# Altium footprint library connectors.PcbLib: 256 footprints (part 2 of 16)
Each footprint in its own frame and in the unit in brackets; x right, y up, seen from the top. Pads: shape width x height; smd on the part's side, far side on the other; paste and mask are expansions set on the pad; w line width, h text height; cw(c..) or ccw(c..) is an arc to the next point about the centre after c.
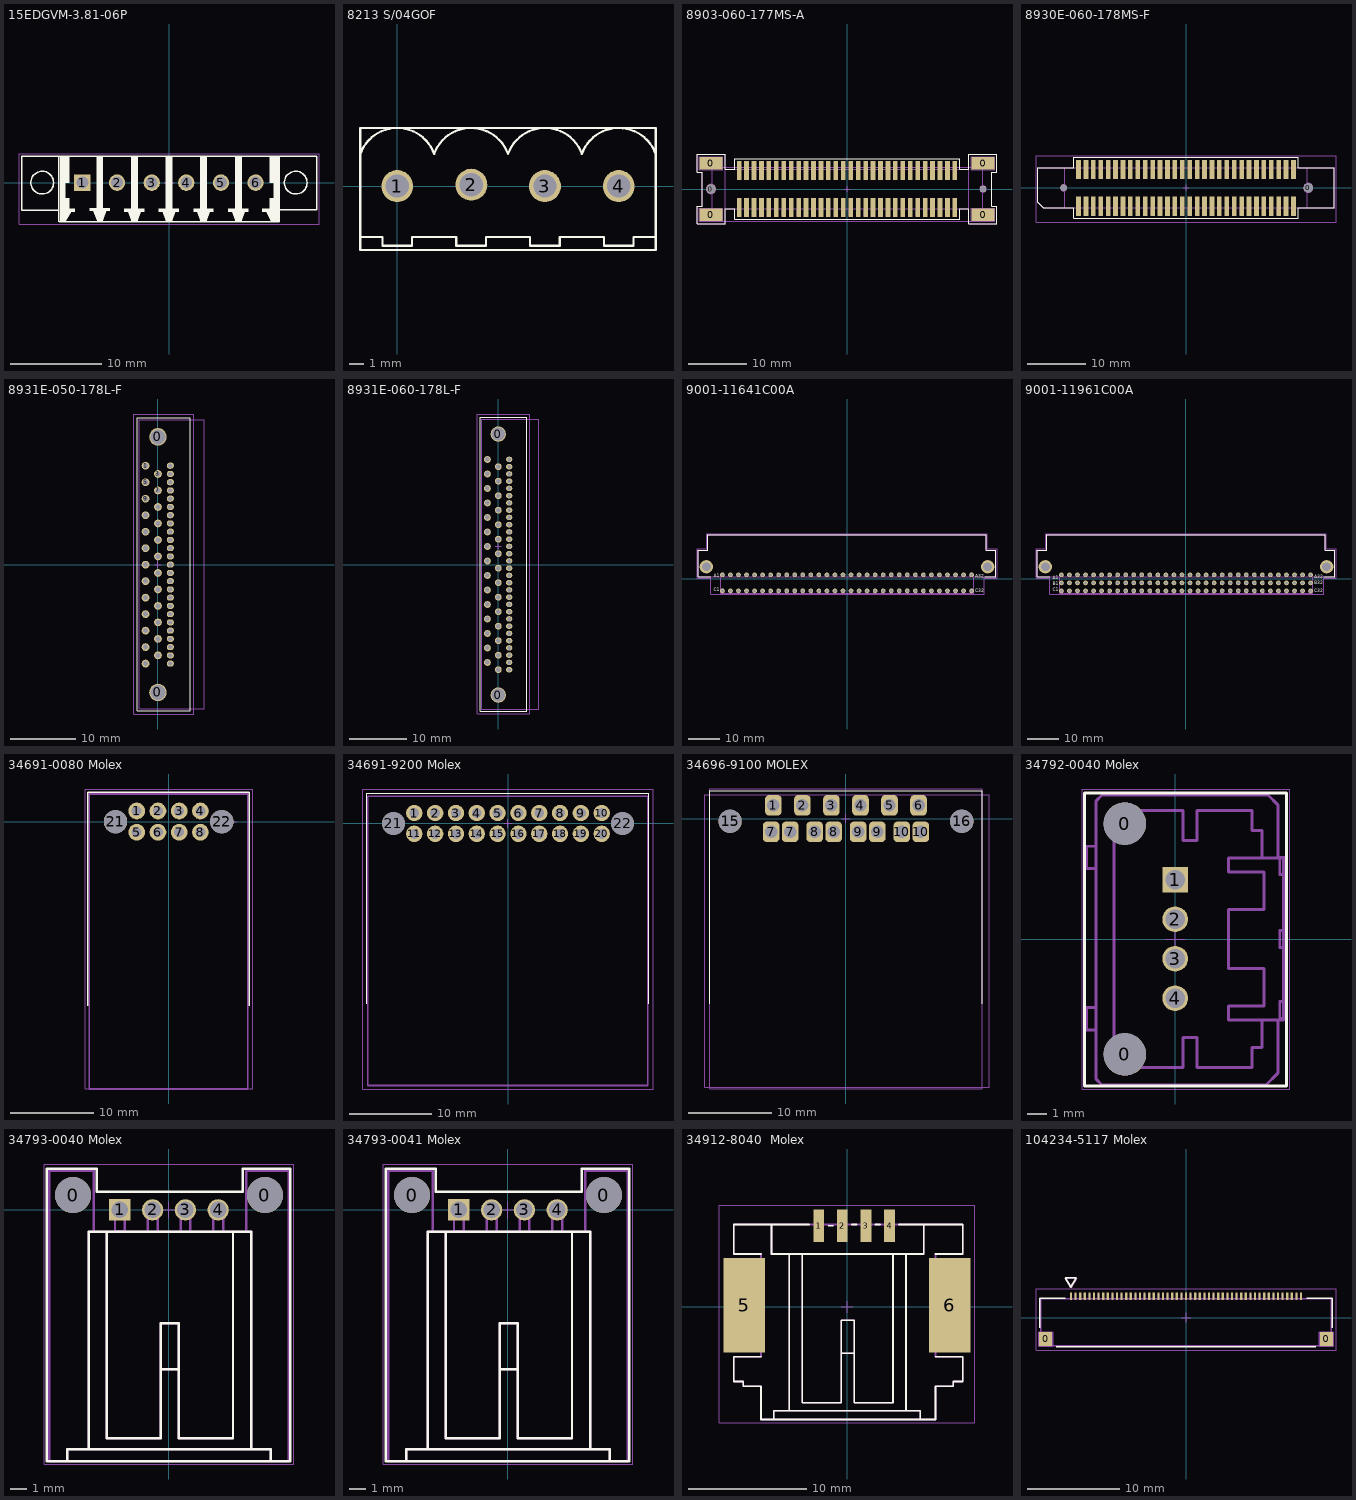
[diagram p1: the footprints below, top view; thin cyan lines are the x and y axes]

## 15EDGVM-3.81-06P [mm] "Разъем на плату, вилка DAGSON"
height 9.2
pads (6):
  rect 1.8x1.8 hole 1.3: 1(-9.525,0)
  round 1.8 hole 1.3: 2(-5.715,0) 3(-1.905,0) 4(1.905,0) 5(5.715,0) 6(9.525,0)
Top Overlay:
  circle w0.15: c13.944,0 r1.25
  circle w0.15: c-13.945,0 r1.25
  region: 7.285,2.8 7.285,-2.9 7.985,-2.9 7.985,2.8
  region: 7.335,-4.3 6.935,-3.2 6.535,-3.2 6.535,-2.9 8.735,-2.9 8.735,-3.2 8.335,-3.2 7.935,-4.3
  region: -4.105,-4.3 -4.505,-3.2 -4.905,-3.2 -4.905,-2.9 -2.705,-2.9 -2.705,-3.2 -3.105,-3.2 -3.505,-4.3
  region: -0.305,-4.3 -0.705,-3.2 -1.105,-3.2 -1.105,-2.9 1.095,-2.9 1.095,-3.2 0.695,-3.2 0.295,-4.3
  region: 3.495,-4.3 3.095,-3.2 2.695,-3.2 2.695,-2.9 4.895,-2.9 4.895,-3.2 4.495,-3.2 4.095,-4.3
  region: -4.155,2.8 -4.155,-2.9 -3.455,-2.9 -3.455,2.8
  region: -0.355,2.8 -0.355,-2.9 0.345,-2.9 0.345,2.8
  region: 3.445,2.8 3.445,-2.9 4.145,-2.9 4.145,2.8
  region: -10.965,2.8 -10.965,0 -11.415,0 -11.415,-1.7 -10.965,-1.7 -10.965,-2.9 -10.365,-2.9 -10.365,-3.2 -10.765,-3.2 -11.415,-4.3 -11.99,-4.3 -11.99,2.8
  region: 11.07,2.8 11.07,0 11.545,0 11.545,-1.7 11.07,-1.7 11.095,-2.9 10.245,-2.9 10.245,-3.2 10.67,-3.2 11.245,-4.3 12.045,-4.3 12.045,2.8
  region: -7.965,2.9 -7.965,-2.8 -7.265,-2.8 -7.265,2.9
  region: -7.915,-4.2 -8.315,-3.1 -8.715,-3.1 -8.715,-2.8 -6.515,-2.8 -6.515,-3.1 -6.915,-3.1 -7.315,-4.2
  lines w0.15: -16.205,-3.027 -16.205,2.896 -16.201,2.9 -12.115,2.9 -12.115,-4.3 ; -16.205,-3.023 -16.201,-3.027 -12.11,-3.027 ; -12.065,-4.3 12.135,-4.3 12.135,2.9 ; -12.065,2.9 12.135,2.9 ; -6.915,2.9 -2.824,2.9 ; 12.135,-2.997 16.231,-2.997 16.231,2.9 12.135,2.9 ; 16.226,2.9 16.231,2.896
TopAssy 13:
TopCourt 15:
  lines w0.05: -0.5,0 0.5,0 ; 0,-0.5 0,0.5 ; -16.5,-4.6 16.5,-4.6 16.5,3.2 -16.5,3.2 -16.5,-4.6

## 8213 S/04GOF [mm] "Разъем на плату, шаг 5.08, вилка 25.350.3453.0 WIECON"
height 12
pads (4):
  round 2.2 hole 1.6: 1(0,0) 2(5.1,0.1) 3(10.16,0) 4(15.24,0)
Top Overlay:
  lines w0.15: -2.545,2.202 cw(c0,1.3) 2.545,2.202 ; -2.54,-3.5 -1.016,-3.5 -1.016,-4.1 1.016,-4.1 1.016,-3.5 4.064,-3.5 4.064,-4.1 6.096,-4.1 6.096,-3.5 9.144,-3.5 9.144,-4.1 11.176,-4.1 11.176,-3.5 14.224,-3.5 14.224,-4.1 16.256,-4.1 16.256,-3.5 17.78,-3.5 ; 2.536,2.205 cw(c5.08,1.3) 7.625,2.202 ; 7.615,2.202 cw(c10.16,1.3) 12.705,2.202 ; 12.696,2.205 cw(c15.24,1.3) 17.785,2.202 ; -2.54,-4.4 -2.54,4 17.78,4 17.78,-4.4 -2.54,-4.4
TopAssy 13:
3D body "Wieland_25.350.3453.0_CAD STEP data 8213 S.STP": height 12.1, standoff -3.4, extent -3.26,-4.4 18.46,4

## 8903-060-177MS-A [mm] "LOW PROFILE IDC CONNECTOR, SMD"
pads (66):
  rect 4x2.2 smd: 0(-23.215,-4.4) 0(-23.215,4.4) 0(23.215,-4.4) 0(23.215,4.4)
  round 1.6 hole 1.6 unplated: 0(-23.215,0)
  round 1.1 hole 1.1 unplated: 0(23.215,0)
  rect 0.8x3.3 smd: 1(18.415,-3.15) 2(18.415,3.15) 3(17.145,-3.15) 4(17.145,3.15) 5(15.875,-3.15) 6(15.875,3.15) 7(14.605,-3.15) 8(14.605,3.15) 9(13.335,-3.15) 10(13.335,3.15) 11(12.065,-3.15) 12(12.065,3.15) 13(10.795,-3.15) 14(10.795,3.15) 15(9.525,-3.15) 16(9.525,3.15) 17(8.255,-3.15) 18(8.255,3.15) 19(6.985,-3.15) 20(6.985,3.15) 21(5.715,-3.15) 22(5.715,3.15) 23(4.445,-3.15) 24(4.445,3.15) 25(3.175,-3.15) 26(3.175,3.15) 27(1.905,-3.15) 28(1.905,3.15) 29(0.635,-3.15) 30(0.635,3.15) 31(-0.635,-3.15) 32(-0.635,3.15) 33(-1.905,-3.15) 34(-1.905,3.15) 35(-3.175,-3.15) 36(-3.175,3.15) 37(-4.445,-3.15) 38(-4.445,3.15) 39(-5.715,-3.15) 40(-5.715,3.15) 41(-6.985,-3.15) 42(-6.985,3.15) 43(-8.255,-3.15) 44(-8.255,3.15) 45(-9.525,-3.15) 46(-9.525,3.15) 47(-10.795,-3.15) 48(-10.795,3.15) 49(-12.065,-3.15) 50(-12.065,3.15) 51(-13.335,-3.15) 52(-13.335,3.15) 53(-14.605,-3.15) 54(-14.605,3.15) 55(-15.875,-3.15) 56(-15.875,3.15) 57(-17.145,-3.15) 58(-17.145,3.15) 59(-18.415,-3.15) 60(-18.415,3.15)
Top Overlay:
  lines w0.15: -25.6,5.898 -25.6,2.9 -24.7,2.9 -24.7,-2.902 -25.6,-2.902 -25.6,-5.9 -20.8,-5.9 -20.8,-3.4 -19.2,-3.4 -19.2,-5.2 19.2,-5.2 19.2,-3.4 20.8,-3.4 20.8,-5.9 25.6,-5.9 25.6,-2.902 24.7,-2.902 24.7,2.9 25.6,2.9 25.6,5.898 ; -25.6,5.9 -20.8,5.9 -20.8,3.4 -19.2,3.4 -19.2,5.2 19.2,5.2 19.2,3.4 20.8,3.4 20.8,5.9 25.6,5.9
  text "." at 18.3,-5.8 h1.52
TopAssy 13:
  drawing of 220 lines, arcs and shapes, not listed
TopCourt 15:
  lines w0.05: -0.5,0 0.5,0 ; 0,-0.5 0,0.5 ; -23,-5.5 -23,3.7 23.2,3.7 23.2,-5.5 -23,-5.5
3D body "8903-060-177MS-A_stp.stp": height 4.61, standoff -0.89, extent -24.7,-6.125 24.73,6.125

## 8930E-060-178MS-F [mm] "LOW PROFILE IDC CONNECTOR, SMD"
height 5
pads (62):
  round 1.1 hole 1.1 unplated: 0(-20.955,0)
  round 1.6 hole 1.6 unplated: 0(20.955,0)
  rect 0.8x3.3 smd: 1(-18.415,-3.15) 2(-18.415,3.15) 3(-17.145,-3.15) 4(-17.145,3.15) 5(-15.875,-3.15) 6(-15.875,3.15) 7(-14.605,-3.15) 8(-14.605,3.15) 9(-13.335,-3.15) 10(-13.335,3.15) 11(-12.065,-3.15) 12(-12.065,3.15) 13(-10.795,-3.15) 14(-10.795,3.15) 15(-9.525,-3.15) 16(-9.525,3.15) 17(-8.255,-3.15) 18(-8.255,3.15) 19(-6.985,-3.15) 20(-6.985,3.15) 21(-5.715,-3.15) 22(-5.715,3.15) 23(-4.445,-3.15) 24(-4.445,3.15) 25(-3.175,-3.15) 26(-3.175,3.15) 27(-1.905,-3.15) 28(-1.905,3.15) 29(-0.635,-3.15) 30(-0.635,3.15) 31(0.635,-3.15) 32(0.635,3.15) 33(1.905,-3.15) 34(1.905,3.15) 35(3.175,-3.15) 36(3.175,3.15) 37(4.445,-3.15) 38(4.445,3.15) 39(5.715,-3.15) 40(5.715,3.15) 41(6.985,-3.15) 42(6.985,3.15) 43(8.255,-3.15) 44(8.255,3.15) 45(9.525,-3.15) 46(9.525,3.15) 47(10.795,-3.15) 48(10.795,3.15) 49(12.065,-3.15) 50(12.065,3.15) 51(13.335,-3.15) 52(13.335,3.15) 53(14.605,-3.15) 54(14.605,3.15) 55(15.875,-3.15) 56(15.875,3.15) 57(17.145,-3.15) 58(17.145,3.15) 59(18.415,-3.15) 60(18.415,3.15)
Top Overlay:
  lines w0.15: -25.4,-2.5 -24.5,-3.4 -20.8,-3.4 -19.2,-3.4 -19.2,-5.2 19.2,-5.2 19.2,-3.4 20.8,-3.4 25.4,-3.4 25.4,3.4 20.8,3.4 19.2,3.4 19.2,5.2 -19.2,5.2 -19.2,3.4 -20.8,3.4 -25.4,3.4 -25.4,-2.5
  text "." at -18.3,-5.8 h1.52
TopAssy 13:
  drawing of 193 lines, arcs and shapes, not listed
TopCourt 15:
  lines w0.05: -0.5,0 0.5,0 ; 0,-0.5 0,0.5 ; -25.7,-5.9 -25.7,5.5 25.7,5.5 25.7,-5.9 -25.7,-5.9
3D body "P39444_8930E-060-178MS-F_s.stp": height 5.01, standoff -0.79, extent -25.415,-4.3 25.415,4.3

## 8931E-050-178L-F [mm] "LOW PROFILE IDC CONNECTOR Right angle, Through hole"
pads (52):
  round 2.7 hole 2.3: 0(0,-19.685) 0(0,19.685)
  round 1.2 hole 0.8: 1(-1.905,15.24) 3(0,13.97) 5(-1.905,12.7) 7(0,11.43) 9(-1.905,10.16) 11(0,8.89) 13(-1.905,7.62) 15(0,6.35) 17(-1.905,5.08) 19(0,3.81) 21(-1.905,2.54) 23(0,1.27) 25(-1.905,0) 27(0,-1.27) 29(-1.905,-2.54) 31(0,-3.81) 33(-1.905,-5.08) 35(0,-6.35) 37(-1.905,-7.62) 39(0,-8.89) 41(-1.905,-10.16) 43(0,-11.43) 45(-1.905,-12.7) 47(0,-13.97) 49(-1.905,-15.24)
  oval 1.1x0.95 hole 0.65: 2(1.905,15.24) 4(1.905,13.97) 6(1.905,12.7) 8(1.905,11.43) 10(1.905,10.16) 12(1.905,8.89) 14(1.905,7.62) 16(1.905,6.35) 18(1.905,5.08) 20(1.905,3.81) 22(1.905,2.54) 24(1.905,1.27) 26(1.905,0) 28(1.905,-1.27) 30(1.905,-2.54) 32(1.905,-3.81) 34(1.905,-5.08) 36(1.905,-6.35) 38(1.905,-7.62) 40(1.905,-8.89) 42(1.905,-10.16) 44(1.905,-11.43) 46(1.905,-12.7) 48(1.905,-13.97) 50(1.905,-15.24)
Top Overlay:
  lines w0.15: -3.2,-22.5 -3.2,22.6 5,22.6 5,-22.5 -3.2,-22.5
  text "." at -4.245,15.69 h1.52
TopAssy 13:
  lines w0.15: -2.9,-22.2 7.1,-22.2 7.1,22.3 -2.9,22.3 -2.9,-22.2
TopCourt 15:
  lines w0.05: -0.5,0 0.5,0 ; 0,-0.5 0,0.5 ; -3.7,-23 5.5,-23 5.5,23.2 -3.7,23.2 -3.7,-23
3D body "P39455_8931E-050-178L-F_s.stp": height 7.01, standoff -2.99, extent -2.895,-22.24 7.105,22.24

## 8931E-060-178L-F [mm] "LOW PROFILE IDC CONNECTOR Right angle, Through hole"
pads (62):
  round 2.7 hole 2.3: 0(0,-22.86) 0(0,22.86)
  round 1.2 hole 0.8: 1(-1.905,18.415) 3(0,17.145) 5(-1.905,15.875) 7(0,14.605) 9(-1.905,13.335) 11(0,12.065) 13(-1.905,10.795) 15(0,9.525) 17(-1.905,8.255) 19(0,6.985) 21(-1.905,5.715) 23(0,4.445) 25(-1.905,3.175) 27(0,1.905) 29(-1.905,0.635) 31(0,-0.635) 33(-1.905,-1.905) 35(0,-3.175) 37(-1.905,-4.445) 39(0,-5.715) 41(-1.905,-6.985) 43(0,-8.255) 45(-1.905,-9.525) 47(0,-10.795) 49(-1.905,-12.065) 51(0,-13.335) 53(-1.905,-14.605) 55(0,-15.875) 57(-1.905,-17.145) 59(0,-18.415)
  oval 1.1x0.95 hole 0.65: 2(1.905,18.415) 4(1.905,17.145) 6(1.905,15.875) 8(1.905,14.605) 10(1.905,13.335) 12(1.905,12.065) 14(1.905,10.795) 16(1.905,9.525) 18(1.905,8.255) 20(1.905,6.985) 22(1.905,5.715) 24(1.905,4.445) 26(1.905,3.175) 28(1.905,1.905) 30(1.905,0.635) 32(1.905,-0.635) 34(1.905,-1.905) 36(1.905,-3.175) 38(1.905,-4.445) 40(1.905,-5.715) 42(1.905,-6.985) 44(1.905,-8.255) 46(1.905,-9.525) 48(1.905,-10.795) 50(1.905,-12.065) 52(1.905,-13.335) 54(1.905,-14.605) 56(1.905,-15.875) 58(1.905,-17.145) 60(1.905,-18.415)
Top Overlay:
  lines w0.15: -3.2,-25.675 5,-25.675 5,25.775 -3.2,25.775 -3.2,-25.675
  text "." at -4.245,18.865 h1.52
TopAssy 13:
  lines w0.15: -2.9,-25.375 7.1,-25.375 7.1,25.475 -2.9,25.475 -2.9,-25.375
TopCourt 15:
  lines w0.05: -0.5,3.175 0.5,3.175 ; 0,2.675 0,3.675 ; -3.7,-26.175 5.5,-26.175 5.5,26.375 -3.7,26.375 -3.7,-26.175
3D body "P39455_8931E-060-178L-F_s.stp": height 7.01, standoff -2.99, extent -2.895,-25.415 7.105,25.415

## 9001-11641C00A [mm] "DIN 41612 C Type Male_Right Angle 64 pin"
height 11.1
pads (66):
  round 1.5 hole 1: A1(-39.37,1.27) A2(-36.83,1.27) A3(-34.29,1.27) A4(-31.75,1.27) A5(-29.21,1.27) A6(-26.67,1.27) A7(-24.13,1.27) A8(-21.59,1.27) A9(-19.05,1.27) A10(-16.51,1.27) A11(-13.97,1.27) A12(-11.43,1.27) A13(-8.89,1.27) A14(-6.35,1.27) A15(-3.81,1.27) A16(-1.27,1.27) A17(1.27,1.27) A18(3.81,1.27) A19(6.35,1.27) A20(8.89,1.27) A21(11.43,1.27) A22(13.97,1.27) A23(16.51,1.27) A24(19.05,1.27) A25(21.59,1.27) A26(24.13,1.27) A27(26.67,1.27) A28(29.21,1.27) A29(31.75,1.27) A30(34.29,1.27) A31(36.83,1.27) A32(39.37,1.27) C1(-39.37,-3.81) C2(-36.83,-3.81) C3(-34.29,-3.81) C4(-31.75,-3.81) C5(-29.21,-3.81) C6(-26.67,-3.81) C7(-24.13,-3.81) C8(-21.59,-3.81) C9(-19.05,-3.81) C10(-16.51,-3.81) C11(-13.97,-3.81) C12(-11.43,-3.81) C13(-8.89,-3.81) C14(-6.35,-3.81) C15(-3.81,-3.81) C16(-1.27,-3.81) C17(1.27,-3.81) C18(3.81,-3.81) C19(6.35,-3.81) C20(8.89,-3.81) C21(11.43,-3.81) C22(13.97,-3.81) C23(16.51,-3.81) C24(19.05,-3.81) C25(21.59,-3.81) C26(24.13,-3.81) C27(26.67,-3.81) C28(29.21,-3.81) C29(31.75,-3.81) C30(34.29,-3.81) C31(36.83,-3.81) C32(39.37,-3.81)
  round 4.2 hole 2.8: MH1(-44.45,3.81) MH2(44.45,3.81)
Top Overlay:
  lines w0.15: -43.067,0.71 -47,0.71 -47,9.1 -44,9.1 -44,13.91 -9.13,13.91 28.27,13.91 44,13.91 44,9.1 47,9.1 47,0.71 43.457,0.71
  text "A1" at -42.05,0.55 h1
  text "C1" at -42.15,-3.95 h1
  text "A32" at 40.55,0.35 h1
  text "C32" at 40.55,-4.15 h1
TopAssy 13:
  circle w0.1: c44.45,3.81 r1.334
  circle w0.1: c-44.45,3.81 r1.334
  circle w0.1: c-39.37,1.27 r0.5
  circle w0.1: c-39.37,-3.81 r0.5
  circle w0.1: c39.37,-3.81 r0.5
  circle w0.1: c39.37,1.27 r0.5
  lines w0.1: -39.939,0.71 -39.937,0.708 -39.937,-4.521 40.039,-4.521 40.039,0.71 ; -47,0.71 47,0.71 47,9.1 44,9.1 44,13.91 -44,13.91 -44,9.1 -47,9.1 -47,0.71
TopCourt 15:
  lines w0.05: -47.4,0.2 -47.4,9.506 -44.306,9.506 -44.304,9.509 -44.304,14.3 44.304,14.3 44.304,9.509 44.306,9.506 47.4,9.506 47.4,0.2 ; -47.399,0.2 -43,0.2 -43,-4.9 43.4,-4.9 43.4,0.2 47.399,0.2
3D body "9001-11641C00A.STEP": height 11.01, standoff -1.09, extent -47,-4.109 47,13.91

## 9001-11961C00A [mm] "DIN 41612 C Type Male_Right Angle 96 pin"
height 11.1
pads (98):
  round 1.5 hole 1: A1(-39.37,1.27) A2(-36.83,1.27) A3(-34.29,1.27) A4(-31.75,1.27) A5(-29.21,1.27) A6(-26.67,1.27) A7(-24.13,1.27) A8(-21.59,1.27) A9(-19.05,1.27) A10(-16.51,1.27) A11(-13.97,1.27) A12(-11.43,1.27) A13(-8.89,1.27) A14(-6.35,1.27) A15(-3.81,1.27) A16(-1.27,1.27) A17(1.27,1.27) A18(3.81,1.27) A19(6.35,1.27) A20(8.89,1.27) A21(11.43,1.27) A22(13.97,1.27) A23(16.51,1.27) A24(19.05,1.27) A25(21.59,1.27) A26(24.13,1.27) A27(26.67,1.27) A28(29.21,1.27) A29(31.75,1.27) A30(34.29,1.27) A31(36.83,1.27) A32(39.37,1.27) B1(-39.37,-1.27) B2(-36.83,-1.27) B3(-34.29,-1.27) B4(-31.75,-1.27) B5(-29.21,-1.27) B6(-26.67,-1.27) B7(-24.13,-1.27) B8(-21.59,-1.27) B9(-19.05,-1.27) B10(-16.51,-1.27) B11(-13.97,-1.27) B12(-11.43,-1.27) B13(-8.89,-1.27) B14(-6.35,-1.27) B15(-3.81,-1.27) B16(-1.27,-1.27) B17(1.27,-1.27) B18(3.81,-1.27) B19(6.35,-1.27) B20(8.89,-1.27) B21(11.43,-1.27) B22(13.97,-1.27) B23(16.51,-1.27) B24(19.05,-1.27) B25(21.59,-1.27) B26(24.13,-1.27) B27(26.67,-1.27) B28(29.21,-1.27) B29(31.75,-1.27) B30(34.29,-1.27) B31(36.83,-1.27) B32(39.37,-1.27) C1(-39.37,-3.81) C2(-36.83,-3.81) C3(-34.29,-3.81) C4(-31.75,-3.81) C5(-29.21,-3.81) C6(-26.67,-3.81) C7(-24.13,-3.81) C8(-21.59,-3.81) C9(-19.05,-3.81) C10(-16.51,-3.81) C11(-13.97,-3.81) C12(-11.43,-3.81) C13(-8.89,-3.81) C14(-6.35,-3.81) C15(-3.81,-3.81) C16(-1.27,-3.81) C17(1.27,-3.81) C18(3.81,-3.81) C19(6.35,-3.81) C20(8.89,-3.81) C21(11.43,-3.81) C22(13.97,-3.81) C23(16.51,-3.81) C24(19.05,-3.81) C25(21.59,-3.81) C26(24.13,-3.81) C27(26.67,-3.81) C28(29.21,-3.81) C29(31.75,-3.81) C30(34.29,-3.81) C31(36.83,-3.81) C32(39.37,-3.81)
  round 4.2 hole 2.8: MH1(-44.45,3.81) MH2(44.45,3.81)
Top Overlay:
  lines w0.15: -43.067,0.71 -47,0.71 -47,9.1 -44,9.1 -44,13.91 -9.13,13.91 28.27,13.91 44,13.91 44,9.1 47,9.1 47,0.71 43.457,0.71
  text "A1" at -42.15,-0.05 h1
  text "C1" at -42.15,-3.85 h1
  text "B1" at -42.15,-1.95 h1
  text "A32" at 40.55,0.25 h1
  text "C32" at 40.55,-4.15 h1
  text "B32" at 40.55,-1.75 h1
TopAssy 13:
  circle w0.1: c44.45,3.81 r1.334
  circle w0.1: c-44.45,3.81 r1.334
  circle w0.1: c44.45,3.81 r1.334
  circle w0.1: c-44.45,3.81 r1.334
  lines w0.1: -39.937,0.708 -39.937,-4.521 40.039,-4.521 40.039,0.71 ; -47,0.71 47,0.71 47,9.1 44,9.1 44,13.91 -44,13.91 -44,9.1 -47,9.1 -47,0.71
TopCourt 15:
  lines w0.05: -47.4,0.2 -47.4,9.506 -44.306,9.506 -44.304,9.509 -44.304,14.3 44.304,14.3 44.304,9.509 44.306,9.506 47.4,9.506 47.4,0.2 ; -47.399,0.2 -43,0.2 -43,-4.9 43.5,-4.9 43.5,0.2 47.399,0.2
3D body "9001-11961C00A.STEP": height 11.11, standoff -1.04, extent -47,-4.11 47,13.91

## 34691-0080 Molex [mm] "Molex Stac64 Right Angle Header Assembly, 8 Circuits, Polarization A, Black, Tray"
height 22
pads (10):
  round 2 hole 1.2: 1(-3.81,1.27) 2(-1.27,1.27) 3(1.27,1.27) 4(3.81,1.27) 5(-3.81,-1.27) 6(-1.27,-1.27) 7(1.27,-1.27) 8(3.81,-1.27)
  round 2.8 hole 2.8 unplated: 21(-6.35,0) 22(6.35,0)
Top Overlay:
  lines w0.15: -9.65,-22 -9.65,3.5 9.65,3.5 9.65,-22
TopAssy 13:
  lines w0.2: -9.48,-31.98 9.45,-31.98 9.45,3.3 -9.48,3.3 -9.48,-31.98
TopCourt 15:
  lines w0.05: 7.12,0 8.12,0 ; 7.62,-0.5 7.62,0.5 ; -9.95,-31.98 10.05,-31.98 10.05,3.9 -9.95,3.9 -9.95,-31.98
3D body "346910080.stp": height 21.95, standoff -3.7, extent -9.48,-31.999 9.38,3.277

## 34691-9200 Molex [mm]
height 22
pads (22):
  round 2 hole 1.2: 1(-11.43,1.27) 2(-8.89,1.27) 3(-6.35,1.27) 4(-3.81,1.27) 5(-1.27,1.27) 6(1.27,1.27) 7(3.81,1.27) 8(6.35,1.27) 9(8.89,1.27) 10(11.43,1.27) 11(-11.43,-1.27) 12(-8.89,-1.27) 13(-6.35,-1.27) 14(-3.81,-1.27) 15(-1.27,-1.27) 16(1.27,-1.27) 17(3.81,-1.27) 18(6.35,-1.27) 19(8.89,-1.27) 20(11.43,-1.27)
  round 2.8 hole 2.8 unplated: 21(-13.97,0) 22(13.97,0)
Top Overlay:
  lines w0.15: -17.3,-22 -17.3,3.7 17.2,3.7 17.2,-22
TopAssy 13:
  lines w0.2: -17.1,-31.98 17.07,-31.98 17.07,3.3 -17.1,3.3 -17.1,-31.98
TopCourt 15:
  lines w0.05: -0.5,0 0.5,0 ; 0,-0.5 0,0.5 ; -17.7,-32.4 17.7,-32.4 17.7,4.2 -17.7,4.2 -17.7,-32.4
3D body "346919200.stp": height 22.31, standoff -3.4, extent -17.1,-31.999 17,3.277

## 34696-9100 MOLEX [mm]
height 22
pads (16):
  rrect50% 2x2.5 hole 1.5: 1(-8.75,1.6) 2(-5.25,1.6) 3(-1.75,1.6) 4(1.75,1.6) 5(5.25,1.6) 6(8.75,1.6) 7(-9.025,-1.6) 7(-6.725,-1.6) 8(-3.775,-1.6) 8(-1.475,-1.6) 9(1.475,-1.6) 9(3.775,-1.6) 10(6.725,-1.6) 10(9.025,-1.6)
  round 2.8 hole 2.8 unplated: 15(-13.97,-0.33) 16(13.97,-0.33)
Top Overlay:
  lines w0.15: -16.45,-22.33 -16.45,3.37 16.45,3.37 16.45,-22.33
TopAssy 13:
  lines w0.15: -17,-32.4 17.25,-32.4 17.25,2.9 -17,2.9 -17,-32.4
TopCourt 15:
  lines w0.05: -0.5,0 0.5,0 ; 0,-0.5 0,0.5 ; -16.425,-32.6 16.425,-32.6 16.425,3.57 -16.425,3.57 -16.425,-32.6
3D body "346960100.stp": height 22.26, standoff -3.46, extent -17.1,-32.328 17,2.946

## 34792-0040 Molex [mm] "34792-0040 Molex Mini50™ Unsealed Vertical Header, Single Row, 4 Circuit, Polarization Option A"
pads (6):
  round 2.15 hole 2.15 unplated: 0(-2.55,-5.85) 0(-2.55,5.85)
  rect 1.3x1.3 hole 1: 1(0,3)
  round 1.3 hole 1: 2(0,1) 3(0,-1) 4(0,-3)
Top Overlay:
  lines w0.15: -4.6,-7.45 -4.6,7.4 5.65,7.4 5.65,-7.45 -4.6,-7.45
TopAssy 13:
  lines w0.15: -4,-4.6 -4.5,-4.6 -4.5,-3.462 -4,-3.462 ; -4,3.563 -4.5,3.563 -4.5,4.7 -4,4.7 ; 4.4,-4.1 4.4,-5.5 3.9,-5.5 3.9,-6.5 1.1,-6.5 1.1,-5 0.4,-5 0.4,-6.5 -3.1,-6.5 -3.1,6.5 0.4,6.5 0.4,5 1.1,5 1.1,6.5 3.9,6.5 3.9,5.5 4.4,5.5 4.4,4.1 ; 5.2,-4.1 5.2,-6.8 4.6,-7.4 -3.7,-7.4 -4,-7.1 ; 5.2,4.1 5.2,6.8 4.7,7.3 -3.7,7.3 -4,7 -4,-7.1 ; -4,-7.1 -4,-7.1 ; -0.2,-3.4 0.1,-3.4 0.1,-2.525 -0.2,-2.525 -0.2,-3.4 ; -0.2,-1.4 0.1,-1.4 0.1,-0.525 -0.2,-0.525 -0.2,-1.4 ; -0.2,0.6 0.1,0.6 0.1,1.475 -0.2,1.475 -0.2,0.6 ; -0.2,2.6 -0.2,3.475 0.1,3.475 0.1,2.6 -0.2,2.6 ; 2.7,-4.1 2.7,-3.4 4.5,-3.4 4.5,-1.5 2.7,-1.5 2.7,1.5 4.5,1.5 4.5,3.4 2.7,3.4 2.7,4.1 5.5,4.1 5.5,-4.1 2.7,-4.1 ; 5.3,-4.038 5.3,-3.162 5.6,-3.163 5.6,-4.038 5.3,-4.038 ; 5.3,-0.437 5.3,0.438 5.6,0.438 5.6,-0.437 5.3,-0.437 ; 5.3,3.263 5.3,4.138 5.6,4.138 5.6,3.263 5.3,3.263
TopCourt 15:
  lines w0.05: -0.5,0 0.5,0 ; 0,-0.5 0,0.5 ; -4.7,-7.6 -4.7,7.6 5.8,7.6 5.8,-7.6 -4.7,-7.6
3D body "347920040.stp": height 14.6, standoff -3.73, extent -4.496,-7.336 5.5,7.286

## 34793-0040 Molex [mm] "34793-0040 Molex Mini50™ 4 Positions Header, Shrouded Connector (2.00mm) Through Hole, Right Angle Tin"
pads (6):
  round 2.2 hole 2.2 unplated: 0(-5.85,0.9) 0(5.85,0.9)
  rect 1.3x1.3 hole 1: 1(-3,0)
  round 1.3 hole 1: 2(-1,0) 3(1,0) 4(3,0)
Top Overlay:
  lines w0.15: -6.2,-15.325 -6.2,-14.6 6.2,-14.6 6.2,-15.325 ; -4.895,-14.6 -4.895,-1.325 -3.795,-1.325 ; -0.495,-9.725 0.605,-9.725 ; 5.005,-14.6 5.005,-1.325 3.905,-1.325 ; -3.795,-1.325 -3.795,-13.925 -0.495,-13.925 -0.495,-6.925 0.605,-6.925 0.605,-13.925 3.905,-13.925 3.905,-1.325 ; -3.795,-1.325 3.905,-1.325 ; -7.45,-15.325 -7.45,2.5 -4.4,2.5 -4.4,1.1 4.5,1.1 4.5,2.5 7.4,2.5 7.4,-15.325 -7.45,-15.325
TopAssy 13:
  lines w0.15: -6.2,-15.325 -6.2,-14.6 6.2,-14.6 6.2,-15.325 ; -4.895,-14.6 -4.895,-1.325 ; -0.495,-9.725 0.605,-9.725 ; 5.005,-14.6 5.005,-1.325 ; -4.895,-1.325 -4.6,-1.325 -4.6,2.4 -7.295,2.4 -7.295,-1.325 -7.295,-15.325 7.3,-15.325 7.3,-1.53 7.3,2.4 4.7,2.4 4.7,-1.325 5.005,-1.325 ; -4.895,-1.325 -3.795,-1.325 ; -3.795,-1.325 3.905,-1.325 ; -3.795,-1.325 -3.795,-13.925 -0.495,-13.925 -0.495,-6.925 0.605,-6.925 0.605,-13.925 3.905,-13.925 3.905,-1.325 ; 3.905,-1.325 5.005,-1.325 ; -3.295,-1.3 -3.295,0 -2.7,0 -2.7,-1.3 -3.295,-1.3 ; -1.295,-1.325 -0.7,-1.325 -0.7,0 -1.295,0 -1.295,-1.325 ; 0.705,-1.325 1.3,-1.325 1.3,0 0.705,0 0.705,-1.325 ; 2.705,-1.325 3.3,-1.325 3.3,0 2.705,0 2.705,-1.325
TopCourt 15:
  lines w0.05: -0.5,0 0.5,0 ; 0,-0.5 0,0.5 ; -7.6,-15.5 7.6,-15.5 7.6,2.8 -7.6,2.8 -7.6,-15.5
3D body "347930040.stp": height 10.04, standoff -3.6, extent -7.311,-15.475 7.311,2.325

## 34793-0041 Molex [mm] "34793-0041 Molex Mini50™ 4 Positions Header, Shrouded Connector (2.00mm) Through Hole, Right Angle Tin"
pads (6):
  round 2.2 hole 2.2 unplated: 0(-5.85,0.9) 0(5.85,0.9)
  rect 1.3x1.3 hole 1: 1(-3,0)
  round 1.3 hole 1: 2(-1,0) 3(1,0) 4(3,0)
Top Overlay:
  lines w0.15: -6.2,-15.325 -6.2,-14.6 6.2,-14.6 6.2,-15.325 ; -4.895,-14.6 -4.895,-1.325 -3.795,-1.325 ; -0.495,-9.725 0.605,-9.725 ; 5.005,-14.6 5.005,-1.325 3.905,-1.325 ; -3.795,-1.325 -3.795,-13.925 -0.495,-13.925 -0.495,-6.925 0.605,-6.925 0.605,-13.925 3.905,-13.925 3.905,-1.325 ; -3.795,-1.325 3.905,-1.325 ; -7.45,-15.325 -7.45,2.5 -4.4,2.5 -4.4,1.1 4.5,1.1 4.5,2.5 7.4,2.5 7.4,-15.325 -7.45,-15.325
TopAssy 13:
  lines w0.15: -6.2,-15.325 -6.2,-14.6 6.2,-14.6 6.2,-15.325 ; -4.895,-14.6 -4.895,-1.325 ; -0.495,-9.725 0.605,-9.725 ; 5.005,-14.6 5.005,-1.325 ; -4.895,-1.325 -4.6,-1.325 -4.6,2.4 -7.295,2.4 -7.295,-1.325 -7.295,-15.325 7.3,-15.325 7.3,-1.53 7.3,2.4 4.7,2.4 4.7,-1.325 5.005,-1.325 ; -4.895,-1.325 -3.795,-1.325 ; -3.795,-1.325 3.905,-1.325 ; -3.795,-1.325 -3.795,-13.925 -0.495,-13.925 -0.495,-6.925 0.605,-6.925 0.605,-13.925 3.905,-13.925 3.905,-1.325 ; 3.905,-1.325 5.005,-1.325 ; -3.295,-1.3 -3.295,0 -2.7,0 -2.7,-1.3 -3.295,-1.3 ; -1.295,-1.325 -0.7,-1.325 -0.7,0 -1.295,0 -1.295,-1.325 ; 0.705,-1.325 1.3,-1.325 1.3,0 0.705,0 0.705,-1.325 ; 2.705,-1.325 3.3,-1.325 3.3,0 2.705,0 2.705,-1.325
TopCourt 15:
  lines w0.05: -0.5,0 0.5,0 ; 0,-0.5 0,0.5 ; -7.6,-15.5 7.6,-15.5 7.6,2.8 -7.6,2.8 -7.6,-15.5
3D body "347930041.stp": height 10.04, standoff -3.6, extent -7.311,-15.475 7.311,2.325

## 34912-8040  Molex [mm] "Mini50™ Unsealed Right Angle Header, Single Row, 4 Circuit"
height 9.5
pads (6):
  rect 0.9x2.75 smd: 1(-2.395,6.875) 2(-0.395,6.875) 3(1.605,6.875) 4(3.605,6.875)
  rect 3.5x8 smd paste-3: 5(-8.705,0.125) 6(8.705,0.125)
Top Overlay:
  lines w0.15: -7.295,-4.225 -9.595,-4.225 -9.595,-6.325 -8.795,-6.325 -8.795,-6.725 -7.295,-6.725 -7.295,-9.525 7.505,-9.525 7.505,-6.725 9.005,-6.725 9.005,-6.325 9.805,-6.325 9.805,-4.225 7.505,-4.225 ; -7.295,4.475 -9.595,4.475 -9.595,6.975 -3.195,6.975 ; -6.395,6.975 -6.395,4.475 -4.895,4.475 ; -6.2,-9.525 -6.2,-8.8 6.2,-8.8 6.2,-9.5 ; -4.895,-8.8 -4.895,4.475 ; -1.595,6.875 -1.195,6.875 ; -0.495,-3.925 0.605,-3.925 ; 0.405,6.975 0.805,6.975 ; 2.405,6.975 2.805,6.975 ; 4.405,6.975 9.805,6.975 9.805,4.475 7.505,4.475 ; 5.005,-8.8 5.005,4.475 ; 6.505,6.975 6.505,4.475 5.005,4.475 ; -4.895,4.475 -3.795,4.475 ; -3.795,4.475 3.905,4.475 ; -3.795,4.475 -3.795,-8.125 -0.495,-8.125 -0.495,-1.125 0.605,-1.125 0.605,-8.125 3.905,-8.125 3.905,4.475 ; 3.905,4.475 5.005,4.475
Top Paste:
  rectangle: -10.45,0.425 -8.975,4.125
  rectangle: -8.425,0.425 -6.95,4.125
  rectangle: -10.45,-3.875 -8.975,-0.175
  rectangle: -8.425,-3.875 -6.95,-0.175
  rectangle: 6.95,0.425 8.425,4.125
  rectangle: 9,0.425 10.475,4.125
  rectangle: 6.95,-3.875 8.425,-0.175
  rectangle: 8.975,-3.875 10.45,-0.175
TopAssy 13:
  lines w0.15: -7.4,3.5 -9.6,3.5 -9.6,-3.3 -7.295,-3.3 ; -6.395,6.975 -6.395,4.475 -4.895,4.475 ; -6.2,-9.525 -6.2,-8.8 6.2,-8.8 6.2,-9.525 ; -4.895,-8.8 -4.895,4.475 ; -0.495,-3.925 0.605,-3.925 ; 5.005,-8.8 5.005,4.475 ; 6.505,6.975 6.505,4.475 5.005,4.475 ; 7.495,3.5 9.8,3.5 9.8,-3.3 7.6,-3.3 ; -4.895,4.475 -3.795,4.475 ; -3.795,4.475 -3.795,-8.125 -0.495,-8.125 -0.495,-1.125 0.605,-1.125 0.605,-8.125 3.905,-8.125 3.905,4.475 ; -3.795,4.475 3.905,4.475 ; 3.905,4.475 5.005,4.475 ; -9.595,-6.325 -9.595,-4.225 -7.295,-4.225 -7.295,4.475 -9.595,4.475 -9.595,6.975 -3.195,6.975 9.805,6.975 9.805,4.475 7.505,4.475 7.505,-4.225 9.805,-4.225 9.805,-6.325 9.005,-6.325 9.005,-6.725 7.505,-6.725 7.505,-9.525 -7.295,-9.525 -7.295,-6.725 -8.795,-6.725 -8.795,-6.325 -9.595,-6.325 ; -2.695,5.9 -2.695,8.1 -2.1,8.1 -2.1,5.9 -2.695,5.9 ; -0.695,5.875 -0.1,5.875 -0.1,8.075 -0.695,8.075 -0.695,5.875 ; 1.305,5.875 1.9,5.875 1.9,8.075 1.305,8.075 1.305,5.875 ; 3.305,5.875 3.9,5.875 3.9,8.075 3.305,8.075 3.305,5.875
TopCourt 15:
  lines w0.05: -0.5,0 0.5,0 ; 0,-0.5 0,0.5 ; -10.8,-9.8 -10.8,8.6 10.8,8.6 10.8,-9.8 -10.8,-9.8
3D body "349128040.stp": height 9.63, standoff -0.04, extent -9.49,-9.425 9.7,8.375

## 104234-5117 Molex [mm] "FFC/FPC Connectors,  0.50mm Pitch,  Double Bottom Contacts"
height 1.5
pads (53):
  rect 1.4x1.5 smd: 0(-15.25,-2.325) 0(15.25,-2.325)
  rect 0.24x0.8 smd mask+0.075: 1(-12.5,2.325) 2(-12,2.325) 3(-11.5,2.325) 4(-11,2.325) 5(-10.5,2.325) 6(-10,2.325) 7(-9.5,2.325) 8(-9,2.325) 9(-8.5,2.325) 10(-8,2.325) 11(-7.5,2.325) 12(-7,2.325) 13(-6.5,2.325) 14(-6,2.325) 15(-5.5,2.325) 16(-5,2.325) 17(-4.5,2.325) 18(-4,2.325) 19(-3.5,2.325) 20(-3,2.325) 21(-2.5,2.325) 22(-2,2.325) 23(-1.5,2.325) 24(-1,2.325) 25(-0.5,2.325) 26(0,2.325) 27(0.5,2.325) 28(1,2.325) 29(1.5,2.325) 30(2,2.325) 31(2.5,2.325) 32(3,2.325) 33(3.5,2.325) 34(4,2.325) 35(4.5,2.325) 36(5,2.325) 37(5.5,2.325) 38(6,2.325) 39(6.5,2.325) 40(7,2.325) 41(7.5,2.325) 42(8,2.325) 43(8.5,2.325) 44(9,2.325) 45(9.5,2.325) 46(10,2.325) 47(10.5,2.325) 48(11,2.325) 49(11.5,2.325) 50(12,2.325) 51(12.5,2.325)
Top Overlay:
  lines w0.15: -15.875,-1.125 -15.875,2.125 -13.1,2.125 ; -14.1,-3.175 14.1,-3.175 ; 13.1,2.125 15.875,2.125 15.875,-1.125 ; -13.125,4.313 -11.925,4.313 -12.525,3.313 -13.125,4.313
TopAssy 13:
  lines w0.15: -16,-3.137 -16,-1.575 -14.5,-1.575 -14.5,-3.137 -16,-3.137 ; -15.8,-3.075 -15.8,2.025 15.8,2.025 15.8,-3.075 -15.8,-3.075 ; -13.095,4.288 -12.495,3.288 -11.895,4.288 -13.095,4.288 ; 14.5,-3.137 16,-3.137 16,-1.575 14.5,-1.575 14.5,-3.137
  lines w0.2: -12.5,2.125 -12.5,2.525 ; -12,2.125 -12,2.525 ; -11.5,2.125 -11.5,2.525 ; -11,2.125 -11,2.525 ; -10.5,2.125 -10.5,2.525 ; -10,2.125 -10,2.525 ; -9.5,2.125 -9.5,2.525 ; -9,2.125 -9,2.525 ; -8.5,2.125 -8.5,2.525 ; -8,2.125 -8,2.525 ; -7.5,2.125 -7.5,2.525 ; -7,2.125 -7,2.525 ; -6.5,2.125 -6.5,2.525 ; -6,2.125 -6,2.525 ; -5.5,2.125 -5.5,2.525 ; -5,2.125 -5,2.525 ; -4.5,2.125 -4.5,2.525 ; -4,2.125 -4,2.525 ; -3.5,2.125 -3.5,2.525 ; -3,2.125 -3,2.525 ; -2.5,2.125 -2.5,2.525 ; -2,2.125 -2,2.525 ; -1.5,2.125 -1.5,2.525 ; -1,2.125 -1,2.525 ; -0.5,2.125 -0.5,2.525 ; 0,2.125 0,2.525 ; 0.5,2.125 0.5,2.525 ; 1,2.125 1,2.525 ; 1.5,2.125 1.5,2.525 ; 2,2.125 2,2.525 ; 2.5,2.125 2.5,2.525 ; 3,2.125 3,2.525 ; 3.5,2.125 3.5,2.525 ; 4,2.125 4,2.525 ; 4.5,2.125 4.5,2.525 ; 5,2.125 5,2.525 ; 5.5,2.125 5.5,2.525 ; 6,2.125 6,2.525 ; 6.5,2.125 6.5,2.525 ; 7,2.125 7,2.525 ; 7.5,2.125 7.5,2.525 ; 8,2.125 8,2.525 ; 8.5,2.125 8.5,2.525 ; 9,2.125 9,2.525 ; 9.5,2.125 9.5,2.525 ; 10,2.125 10,2.525 ; 10.5,2.125 10.5,2.525 ; 11,2.125 11,2.525 ; 11.5,2.125 11.5,2.525 ; 12,2.125 12,2.525 ; 12.5,2.125 12.5,2.525
TopCourt 15:
  lines w0.05: -0.5,0 0.5,0 ; 0,-0.5 0,0.5 ; -16.3,-3.537 16.3,-3.537 16.3,3.125 -16.3,3.125 -16.3,-3.537
3D body "6268450110e9alf.stp": height 2.04, standoff -0.02, extent -15.494,-2.526 15.006,3.114